# Altium schematic symbol library relay.SCHLIB: 425 symbols (part 1 of 3) (continued)
## AQZ*
designator K?, comment Power PhotoMOS Relay NAiS   Source: http://www.panasonic-electric-works.com/catalogues/downloads/photomos/ds_x615_en_aqz10_20.pdf
MPN: AQZ102; MPN: AQZ104; MPN: AQZ105; MPN: AQZ107; MPN: AQZ202; MPN: AQZ204; MPN: AQZ205; MPN: AQZ207; MF: AROMAT/ MATSUSHITA; OC_FARNELL: 1448345; OC_NEWARK: 52F5584; OC_FARNELL: unknown; OC_NEWARK: 13P1217; OC_NEWARK: 13P1218; OC_NEWARK: 50B844; OC_FARNELL: 1175735; OC_NEWARK: 13P1220; OC_NEWARK: 13P1222; OC_FARNELL: 1175736; OC_NEWARK: 13P1223; OC_FARNELL: 1129299; OC_NEWARK: 64K3058
footprint AQZ-SIL04
pins: 1 K, 2 A, 3 DS1, 4 DS2

## AQZ*404-PS
designator K?, comment Power PhotoMOS Relay NAiS   Source: http://www.panasonic-electric-works.com/catalogues/downloads/photomos/ds_x615_en_aqz10_20.pdf
MPN: AQZ404; OC_FARNELL: 1101853; OC_NEWARK: 13P1226
footprint AQZ404-PS
pins: 1 K, 2 A, 5 DS1, 6 DS2

## ATP1211S*
designator K?, comment Phototriac Coupler with Zero-Cross NAiS   Source: http://www.mew-europe.com/.. en_ds_61690_0000.pdf
OC_FARNELL: unknown; OC_NEWARK: unknown
footprint SOP04
pins: 1 A, 2 K, 3 DS2, 4 DS1

## ATP2121S*
designator K?, comment Phototriac Coupler none Zero-Cross NAiS   Source: http://www.mew-europe.com/.. en_ds_61690_0000.pdf
OC_FARNELL: unknown; OC_NEWARK: unknown
footprint SOP04
pins: 1 A, 2 K, 3 DS2, 4 DS1

## AZ8-FORM-A
designator K?, comment MINIATURE PC BOARD RELAY Form A   Source: www.azettler.com .. AZ8-1ch-12DSE.PDF
OC_FARNELL: unknown; OC_NEWARK: unknown
footprint AZ8
part A pins: 2 1, 5 2
part B pins: 1 P, 3 S

## AZ8-FORM-C
designator K?, comment MINIATURE PC BOARD RELAY Form C   Source: www.azettler.com .. AZ8-1ch-12DSE.PDF
OC_FARNELL: unknown; OC_NEWARK: unknown
footprint AZ8
part A pins: 2 1, 5 2
part B pins: 1 P, 3 S, 4 O

## BT-*-S
designator K?, comment KLEIN RELAIS WASCHDICHT 2 Wechsler   Distriibutor: Conrad Electronic, Bestell Nr.: 505226-13 - 24V 505226-13 - 5V 505170-13 - 12V 505170-13 - 48V Bestar Electric Ltd.Source: http://www2.produktinfo.conrad.com/datenblaetter/500000-524999/505226-da-01-en-Kleinrelais_waschdicht_24V.pdf
OC_FARNELL: unknown; OC_NEWARK: unknown
footprint BT-XX-S
part A pins: 1, 16 2
part B pins: 4 P, 6 O, 8 S
part C pins: 9 S, 11 O, 13 P

## CB1*
designator K?, comment HIGH POWER AUTOMOTIVE RELAY Form C NAiS   Source: http://www.mew-europe.com/..  en_ds_61202_0000.pdf
MPN: CB1-P-12V; MPN: CB1-P-24V; MPN: CB1F-P-12V; MPN: CB1F-P-24V; MF: AROMAT/ MATSUSHITA; OC_FARNELL: unknown; OC_NEWARK: 52F9201; OC_FARNELL: 4168987; OC_NEWARK: 07C0827; OC_FARNELL: 1414069; OC_NEWARK: 50F4024; OC_FARNELL: 1423191; OC_NEWARK: 94B6706
footprint CB1
part A pins: 85 2, 86 1
part B pins: 30 P, 87 S, 87A O

## CB1*V
designator K?, comment HIGH POWER AUTOMOTIVE RELAY Form A with Diode NAiS   Source: http://www.mew-europe.com/..  en_ds_61202_0000.pdf
MPN: CB1-D-P-12V; MPN: CB1-D-P-24V; MPN: CB1A-D-P-12V; MF: AROMAT/ MATSUSHITA; OC_FARNELL: unknown; OC_NEWARK: 10C5390; OC_NEWARK: 10C5392; OC_NEWARK: 13P2827; OC_NEWARK: unknown
footprint CB1
part A pins: 85 -, 86 +
part B pins: 30 P, 87 S

## CB*
designator K?, comment HIGH POWER AUTOMOTIVE RELAY Form A NAiS   Source: http://www.mew-europe.com/..  en_ds_61202_0000.pdf
MPN: CB1A-P-12V; MPN: CB1A-P-24V; MPN: CB1A-T-P-12V; MF: AROMAT/ MATSUSHITA; OC_FARNELL: 1270582; OC_NEWARK: 50B849; OC_FARNELL: unknown; OC_NEWARK: 13P2833; OC_NEWARK: 26H6273; OC_NEWARK: unknown
footprint CB1
part A pins: 85 2, 86 1
part B pins: 30 P, 87 S

## CF2*
designator K?, comment NEW DUAL POWER AUTOMOTIVE RELAY NAiS   Source: http://www.mew-europe.com/..  en_ds_61203_0000.pdf
OC_FARNELL: unknown; OC_NEWARK: unknown
footprint CF
part A pins: 1, 1A 2
part B pins: 2 1, 2A 2
part C pins: C1 COM1, C2 COM2, NC, NO

## CM1*
designator K?, comment AUTOMOTIVE MICRO-ISO RELAY NAiS   en_ds_61204_0000.pdf
MPN: CM1-P-12V; MPN: CM1F-P-12V; MF: AROMAT/ MATSUSHITA; OC_FARNELL: unknown; OC_NEWARK: 50B850; OC_NEWARK: unknown; OC_NEWARK: 10C5503
footprint CM
part A pins: 85 1, 86 2
part B pins: 30 P, 87 S, 87A O

## CM1A*
designator K?, comment AUTOMOTIVE MICRO-ISO RELAY NAiS   en_ds_61204_0000.pdf
MPN: CM1A-P-12V; MPN: CM1AF-P-12V; MF: AROMAT/ MATSUSHITA; OC_FARNELL: unknown; OC_NEWARK: 10C5491; OC_NEWARK: unknown; OC_NEWARK: 10C5497
footprint CM
part A pins: 85 1, 86 2
part B pins: 30 P, 87 S

## CP1?-*
designator K?, comment ULTRA-MINIATURE LOW PROFILE AUTOMOTIVE RELAY NAiS   Source: http://www.mew-europe.com/.. en_ds_61207_0000.pdf
MPN: CP1-12V; MF: AROMAT/ MATSUSHITA; OC_FARNELL: unknown; OC_NEWARK: 10C5508
footprint CP1
part A pins: 1, 2
part B pins: C P, NC O, NO S

## CP1?-*SA
designator K?, comment ULTRA-MINIATURE LOW PROFILE AUTOMOTIVE RELAY NAiS   Source: http://www.mew-europe.com/.. en_ds_61207_0000.pdf
MPN: CP1SA-12V-X; OC_FARNELL: unknown; OC_NEWARK: 96K2384
footprint CP1SA
part A pins: 1, 2
part B pins: C P, NC O, NO S

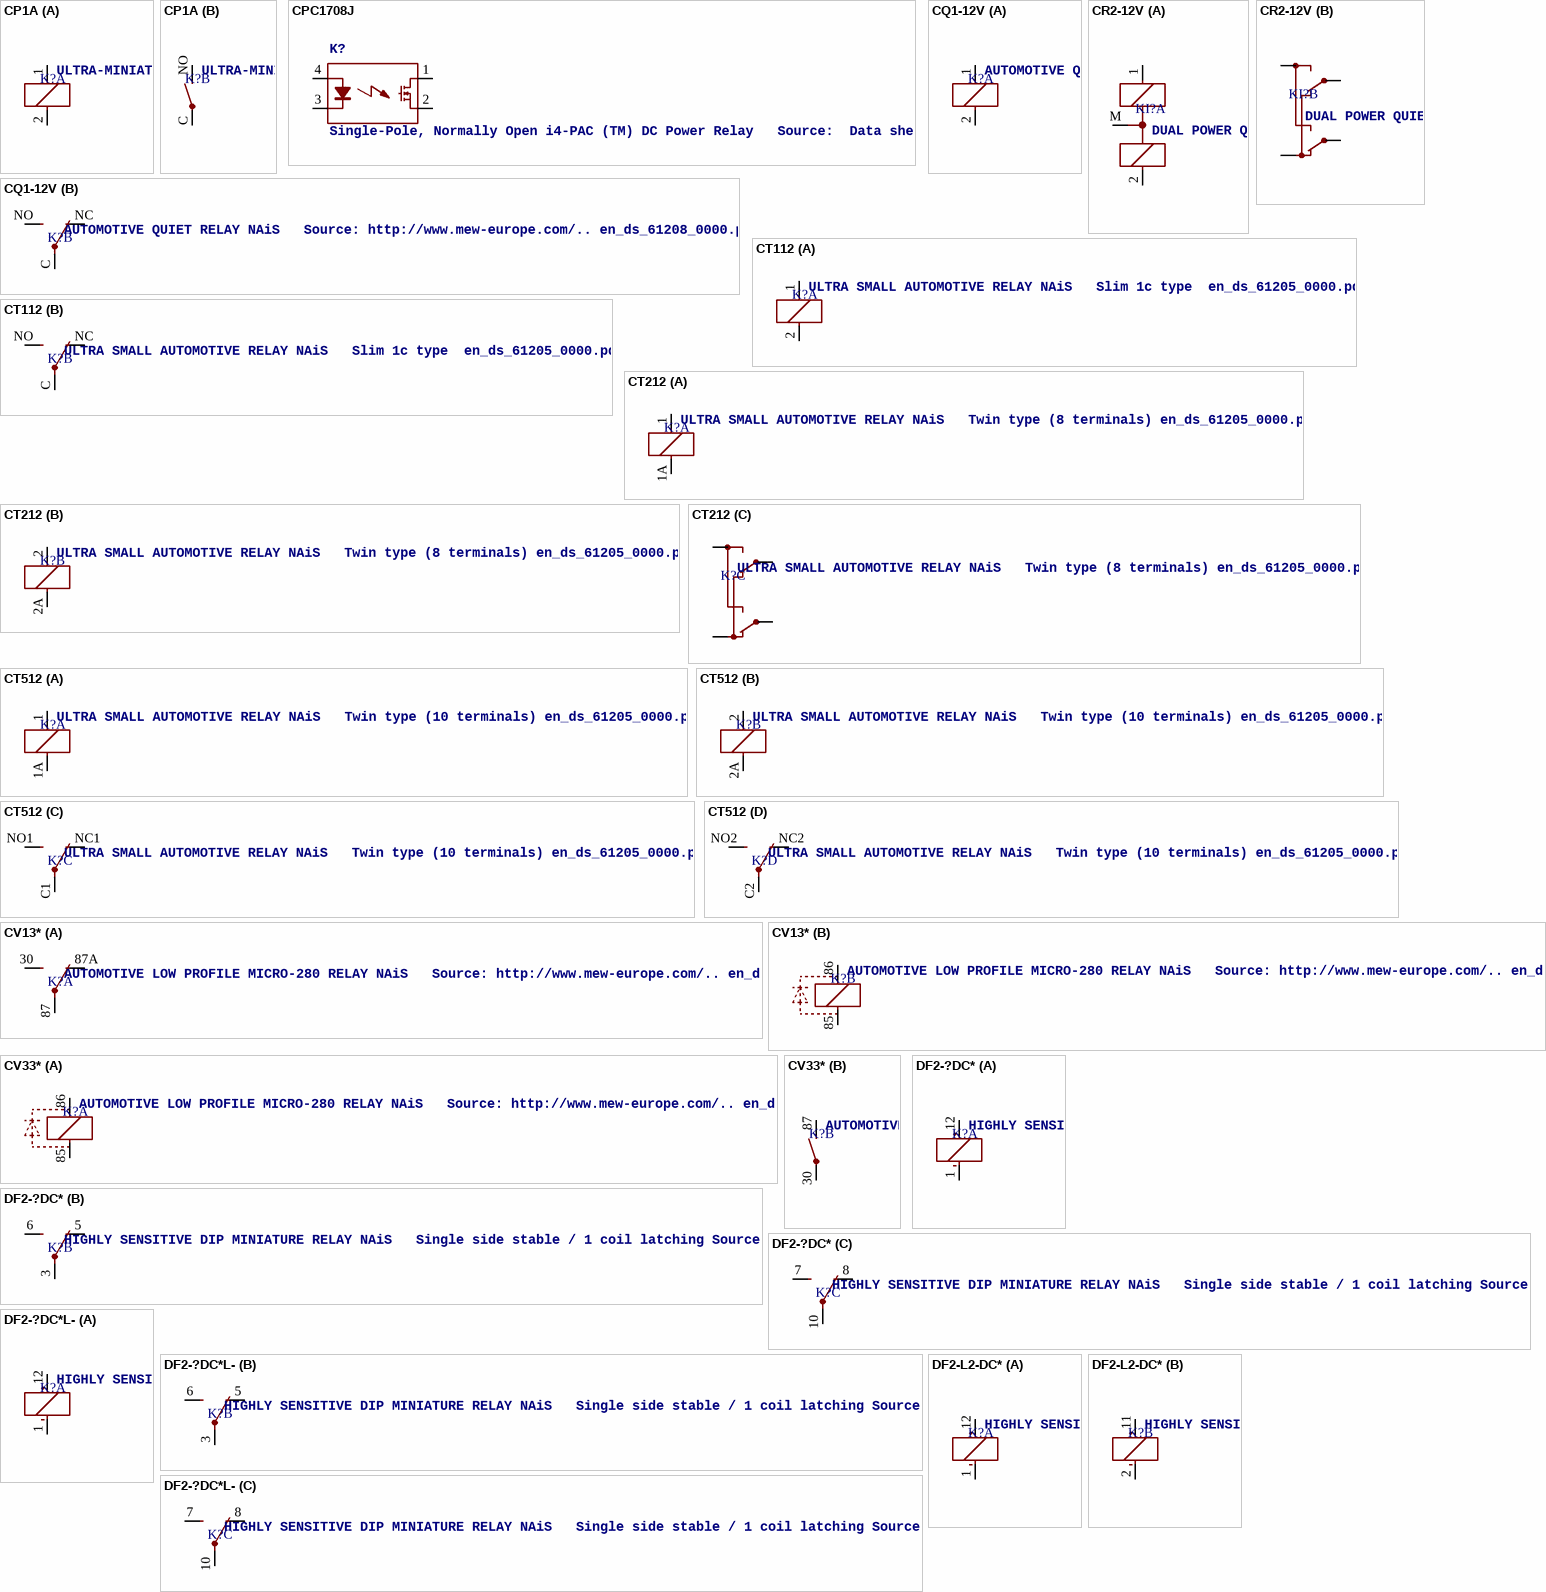
[diagram p5: symbols CP1A to DF2-L2-DC*]

## CP1A
designator K?, comment ULTRA-MINIATURE LOW PROFILE AUTOMOTIVE RELAY NAiS   Source: http://www.mew-europe.com/.. en_ds_61207_0000.pdf
MPN: CP1A-12V; MF: AROMAT/ MATSUSHITA; OC_FARNELL: 1629083; OC_NEWARK: 10C5509
footprint CP1A
part A pins: 1, 2
part B pins: C P, NO S

## CPC1708J
designator K?, comment Single-Pole, Normally Open i4-PAC (TM) DC Power Relay   Source:  Data sheet
footprint I4-PAC
pins: 1 DS1, 2 DS2, 3 K, 4 A

## CQ1-12V
designator K?, comment AUTOMOTIVE QUIET RELAY NAiS   Source: http://www.mew-europe.com/.. en_ds_61208_0000.pdf
OC_FARNELL: unknown; OC_NEWARK: unknown
footprint CQ1
part A pins: 1, 2
part B pins: C P, NC O, NO S

## CR2-12V
designator KI?, comment DUAL POWER QUIET AUTOMOTIVE RELAY NAiS   Source: http://www.mew-europe.com/.. en_ds_61209_0000.pdf
MPN: CR2-12V; MF: AROMAT/ MATSUSHITA; OC_FARNELL: unknown; OC_NEWARK: 10C5511
footprint CR2
part A pins: 1, 2, M
part B pins: C1 COM1, C2 COM2, NC, NO

## CT112
designator K?, comment ULTRA SMALL AUTOMOTIVE RELAY NAiS   Slim 1c type  en_ds_61205_0000.pdf
OC_FARNELL: unknown; OC_NEWARK: unknown
footprint CT-SLIM
part A pins: 1, 2
part B pins: C P, NC O, NO S

## CT212
designator K?, comment ULTRA SMALL AUTOMOTIVE RELAY NAiS   Twin type (8 terminals) en_ds_61205_0000.pdf
OC_FARNELL: unknown; OC_NEWARK: unknown
footprint CT-TWIN
part A pins: 1, 1A 2
part B pins: 2 1, 2A 2
part C pins: C1 COM1, C2 COM2, NC, NO

## CT512
designator K?, comment ULTRA SMALL AUTOMOTIVE RELAY NAiS   Twin type (10 terminals) en_ds_61205_0000.pdf
OC_FARNELL: unknown; OC_NEWARK: unknown
footprint CT2-TWIN
part A pins: 1, 1A 2
part B pins: 2 1, 2A 2
part C pins: C1 P, NC1 O, NO1 S
part D pins: C2 P, NC2 O, NO2 S

## CV13*
designator K?, comment AUTOMOTIVE LOW PROFILE MICRO-280 RELAY NAiS   Source: http://www.mew-europe.com/.. en_ds_61214_0000.pdf
MPN: ACV13012; OC_FARNELL: unknown; OC_NEWARK: 39M3504; OC_NEWARK: unknown
footprint CV-MIRO-280
part A pins: 30 S, 87 P, 87A O
part B pins: 85 -, 86 +

## CV33*
designator K?, comment AUTOMOTIVE LOW PROFILE MICRO-280 RELAY NAiS   Source: http://www.mew-europe.com/.. en_ds_61214_0000.pdf
MPN: ACV33012; OC_FARNELL: unknown; OC_NEWARK: 39M3505; OC_NEWARK: unknown
footprint CV1A-MICRO-280
part A pins: 85 -, 86 +
part B pins: 30 P, 87 S

## DF2-?DC*
designator K?, comment HIGHLY SENSITIVE DIP MINIATURE RELAY NAiS   Single side stable / 1 coil latching Source: http://www.mew-europe.com/..  en_ds_61002_0000.pdf
OC_FARNELL: unknown; OC_NEWARK: unknown
footprint DF2
part A pins: 1 -, 12 +
part B pins: 3 P, 5 O, 6 S
part C pins: 7 S, 8 O, 10 P

## DF2-?DC*L-
designator K?, comment HIGHLY SENSITIVE DIP MINIATURE RELAY NAiS   Single side stable / 1 coil latching Source: http://www.mew-europe.com/..  en_ds_61002_0000.pdf
OC_FARNELL: unknown; OC_NEWARK: unknown
footprint DF2
part A pins: 1 -, 12 +
part B pins: 3 P, 5 O, 6 S
part C pins: 7 S, 8 O, 10 P

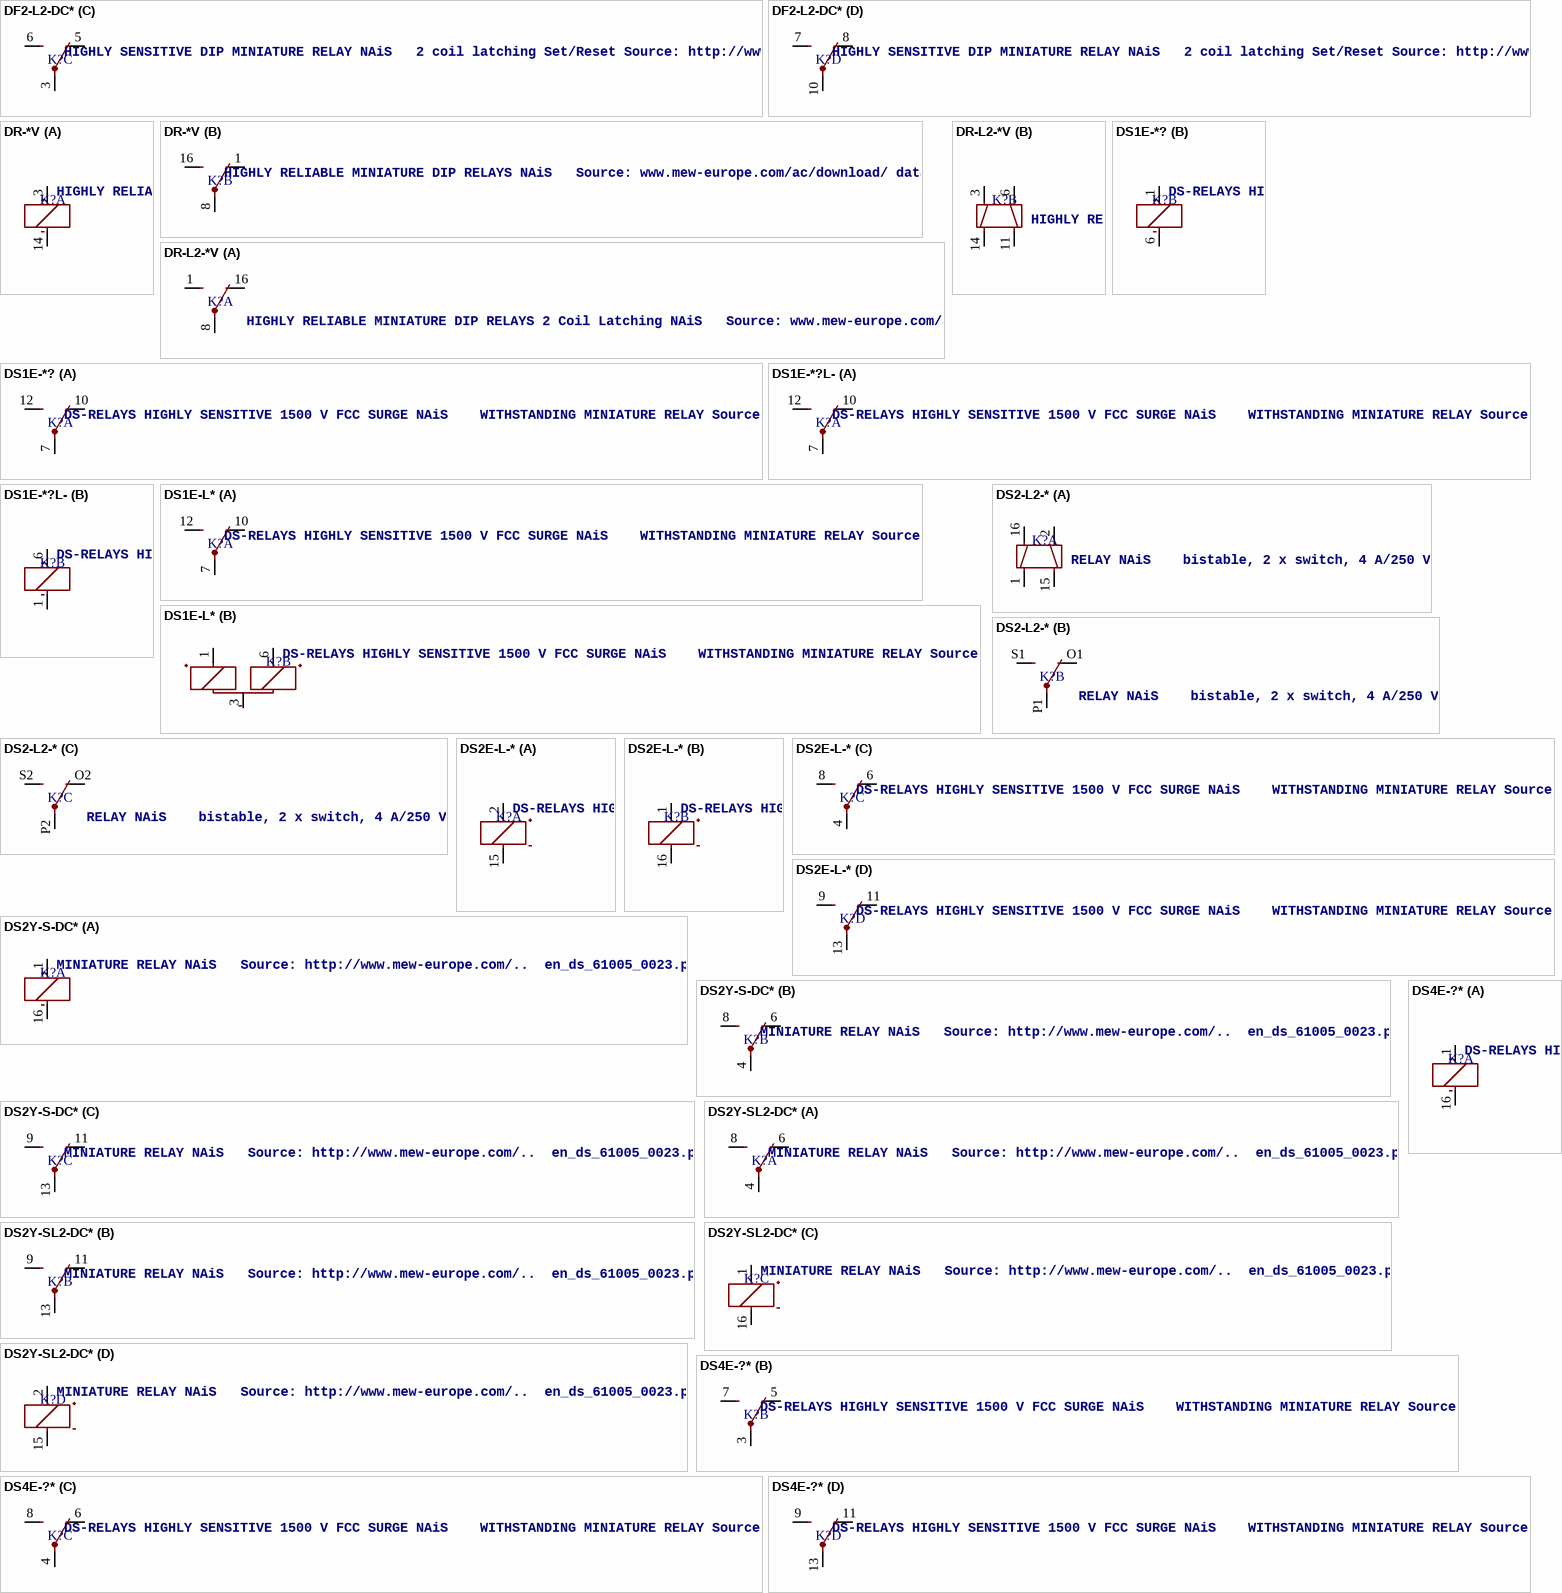
[diagram p6: symbols DF2-L2-DC* to DS4E-?*]

## DF2-L2-DC*
designator K?, comment HIGHLY SENSITIVE DIP MINIATURE RELAY NAiS   2 coil latching Set/Reset Source: http://www.mew-europe.com/..  en_ds_61002_0000.pdf
OC_FARNELL: unknown; OC_NEWARK: unknown
footprint DF2-L2
part A pins: 1 -, 12 +
part B pins: 2 -, 11 +
part C pins: 3 P, 5 O, 6 S
part D pins: 7 S, 8 O, 10 P

## DR-*V
designator K?, comment HIGHLY RELIABLE MINIATURE DIP RELAYS NAiS   Source: www.mew-europe.com/ac/download/ datasheet/relay/dr_en.pdf
MPN: DR-12V; MPN: DR-24V; MPN: DR-5V; OC_FARNELL: 1124066; OC_NEWARK: 91K6794; OC_FARNELL: unknown; OC_NEWARK: unknown; OC_FARNELL: 1124068; OC_NEWARK: 21M8932; OC_FARNELL: 1124065; OC_NEWARK: 24M1478
footprint DR-1
part A pins: 3 +, 14 -
part B pins: 1 O, 8 P, 16 S

## DR-L2-*V
designator K?, comment HIGHLY RELIABLE MINIATURE DIP RELAYS 2 Coil Latching NAiS   Source: www.mew-europe.com/ac/download/datasheet/relay/dr_en.pdf
OC_FARNELL: unknown; OC_NEWARK: unknown
footprint DR-2
part A pins: 1 S, 8 P, 16 O
part B pins: 3 1, 6 3, 11 4, 14 2

## DS1E-*?
designator K?, comment DS-RELAYS HIGHLY SENSITIVE 1500 V FCC SURGE NAiS    WITHSTANDING MINIATURE RELAY Source: http://www.mew-europe.com/..  en_ds_61005_0001.pdf
OC_FARNELL: unknown; OC_NEWARK: unknown
footprint DS1E
part A pins: 7 P, 10 O, 12 S
part B pins: 1 +, 6 -

## DS1E-*?L-
designator K?, comment DS-RELAYS HIGHLY SENSITIVE 1500 V FCC SURGE NAiS    WITHSTANDING MINIATURE RELAY Source: http://www.mew-europe.com/..  en_ds_61005_0001.pdf
MPN: DS1E-S-DC12V; MPN: DS1E-S-DC24V; MPN: DS1E-S-DC48V; MPN: DS1E-S-DC9V; OC_FARNELL: unknown; OC_NEWARK: unknown; OC_FARNELL: 1652598; OC_NEWARK: 13P3215; OC_FARNELL: 1372701; OC_NEWARK: 13P3216; OC_NEWARK: 13P3218; OC_FARNELL: 1608323; OC_FARNELL: 1372683; OC_NEWARK: 13P3221
footprint DS1E
part A pins: 7 P, 10 O, 12 S
part B pins: 1 -, 6 +

## DS1E-L*
designator K?, comment DS-RELAYS HIGHLY SENSITIVE 1500 V FCC SURGE NAiS    WITHSTANDING MINIATURE RELAY Source: http://www.mew-europe.com/..  en_ds_61005_0001.pdf
MPN: DS1E-SL-DC12V; MPN: DS1E-SL-DC48V; MPN: DS1E-SL-DC5V; MF: AROMAT/ MATSUSHITA; OC_FARNELL: unknown; OC_NEWARK: unknown; OC_NEWARK: 13P3222; OC_NEWARK: 10C5700; OC_NEWARK: 10C5701
footprint DS1E-L
part A pins: 7 P, 10 O, 12 S
part B pins: 1 S+, 3 -, 6 R+

## DS2-L2-*
designator K?, comment RELAY NAiS    bistable, 2 x switch, 4 A/250 V
OC_FARNELL: unknown; OC_NEWARK: unknown
footprint DS2E-L2
part A pins: 1 2, 2 3, 15 4, 16 1
part B pins: O1 O, P1 P, S1 S
part C pins: O2 O, P2 P, S2 S

## DS2E-L-*
designator K?, comment DS-RELAYS HIGHLY SENSITIVE 1500 V FCC SURGE NAiS    WITHSTANDING MINIATURE RELAY Source:  Panasonic data sheet
MPN: DS2E-SL-DC24V; MPN: DS2E-SL-DC5V; MF: AROMAT/ MATSUSHITA; OC_FARNELL: unknown; OC_NEWARK: unknown; OC_NEWARK: 10C5812; OC_NEWARK: 10C5815
footprint DS2E-L
part A pins: 2 +, 15 -
part B pins: 1 +, 16 -
part C pins: 4 P, 6 O, 8 S
part D pins: 9 S, 11 O, 13 P

## DS2Y-S-DC*
designator K?, comment MINIATURE RELAY NAiS   Source: http://www.mew-europe.com/..  en_ds_61005_0023.pdf
MPN: DS2Y-S-DC1.5V; MPN: DS2Y-S-DC12V; MPN: DS2Y-S-DC24V; MPN: DS2Y-S-DC3V; MPN: DS2Y-S-DC48V; MPN: DS2Y-S-DC5V; MPN: DS2Y-S-DC6V; MPN: DS2Y-S-DC9V; OC_FARNELL: unknown; OC_NEWARK: 10C5827; OC_NEWARK: 13P3261; OC_NEWARK: 13P3264; OC_NEWARK: 10C5832; OC_NEWARK: 13P3267; OC_NEWARK: 13P3268; OC_NEWARK: 13P3271; OC_NEWARK: 13P3272
footprint DS2Y
part A pins: 1 +, 16 -
part B pins: 4 P, 6 O, 8 S
part C pins: 9 S, 11 O, 13 P

## DS2Y-SL2-DC*
designator K?, comment MINIATURE RELAY NAiS   Source: http://www.mew-europe.com/..  en_ds_61005_0023.pdf
MPN: DS2Y-SL2-DC1.5V; MPN: DS2Y-SL2-DC12V; MPN: DS2Y-SL2-DC24V; MPN: DS2Y-SL2-DC3V; MPN: DS2Y-SL2-DC48V; MPN: DS2Y-SL2-DC5V; MPN: DS2Y-SL2-DC6V; MPN: DS2Y-SL2-DC9V; MF: AROMAT/ MATSUSHITA; OC_FARNELL: unknown; OC_NEWARK: 10C5841; OC_NEWARK: 52F9208; OC_FARNELL: 1372981; OC_NEWARK: 64K3125; OC_NEWARK: 91B6712; OC_NEWARK: 10C5844; OC_NEWARK: 93F4484; OC_NEWARK: 99F8886; OC_NEWARK: 10C5848
footprint DS2Y-2
part A pins: 4 P, 6 O, 8 S
part B pins: 9 S, 11 O, 13 P
part C pins: 1 +, 16 -
part D pins: 2 +, 15 -

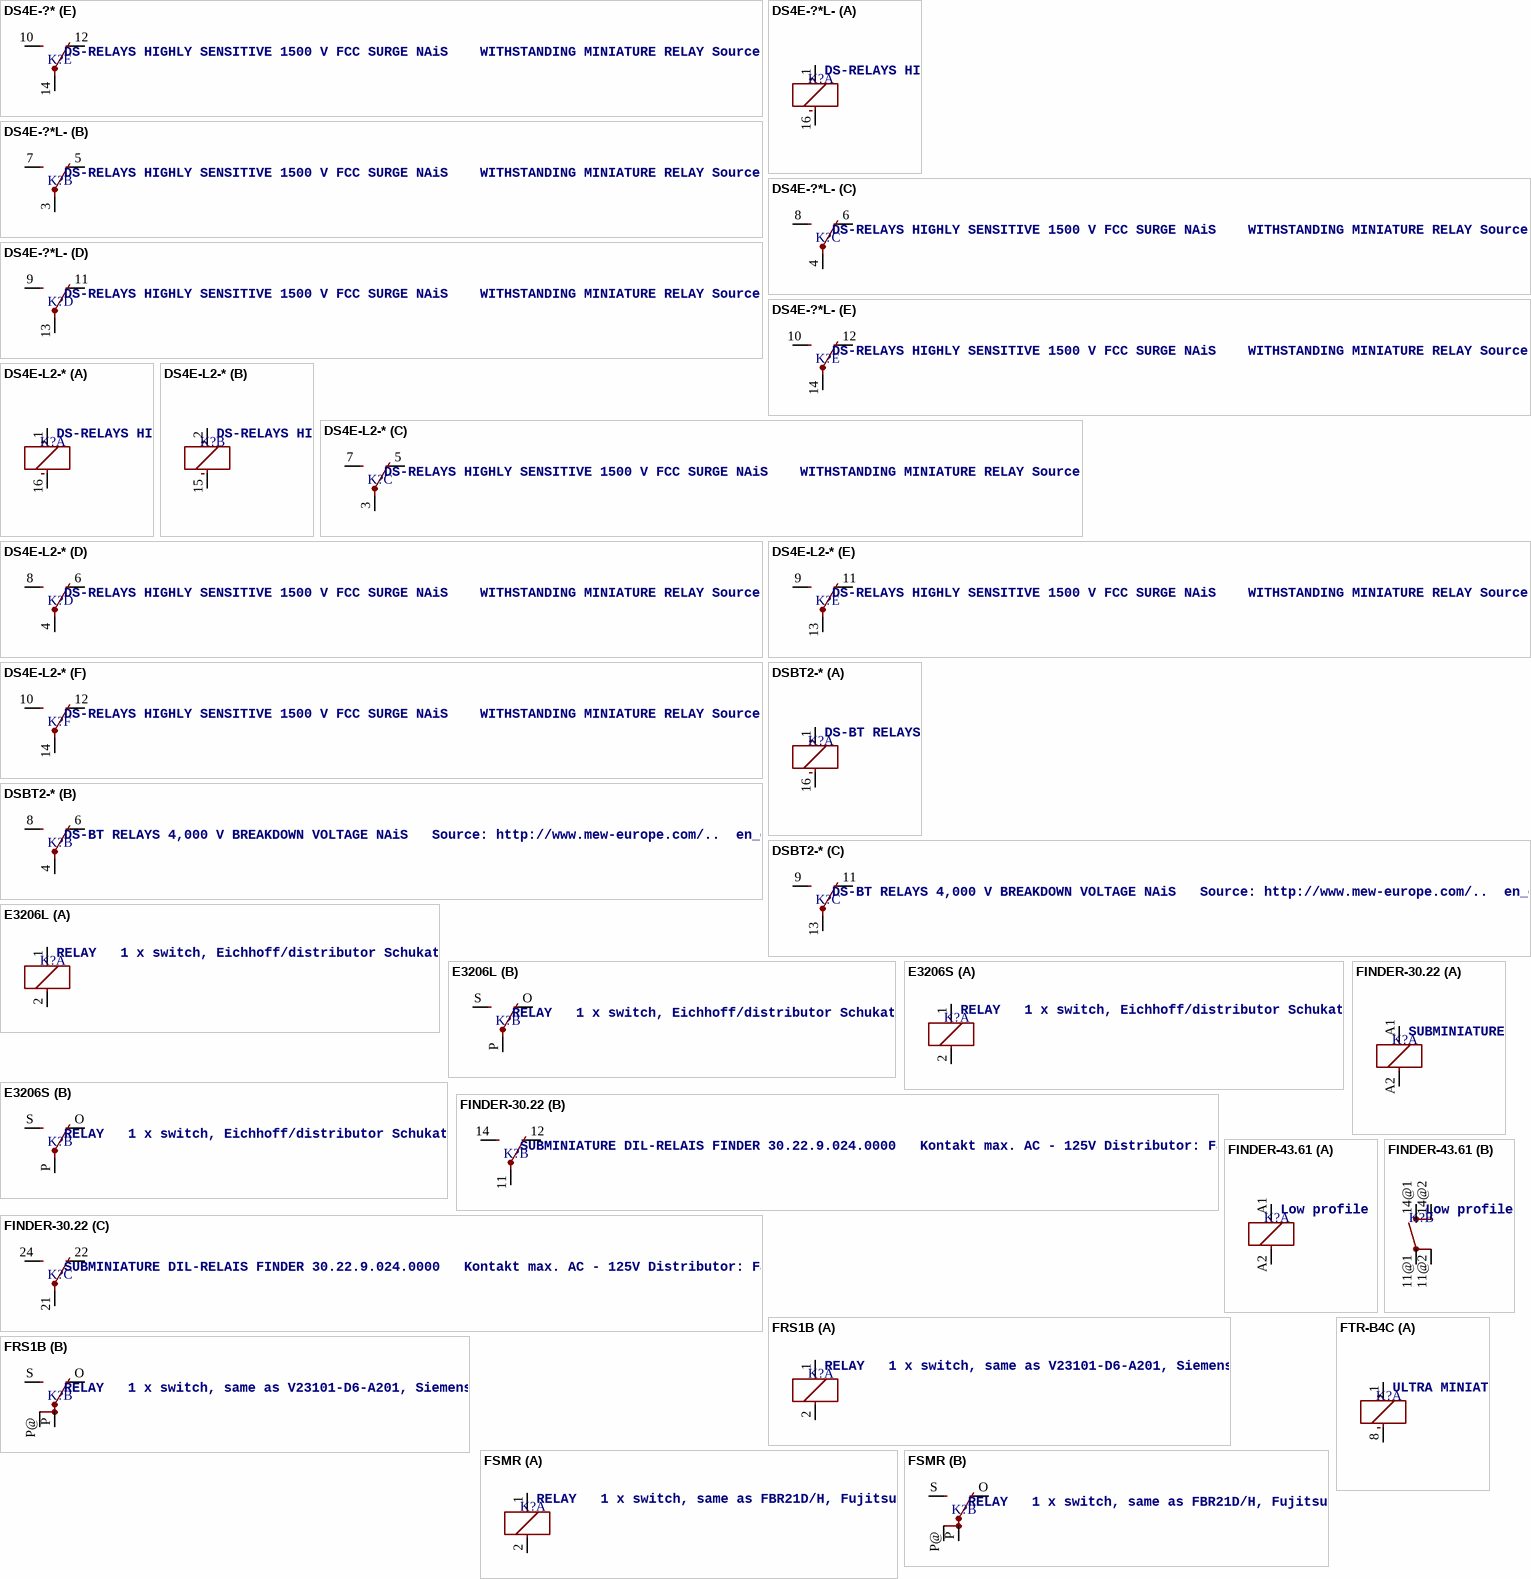
[diagram p7: symbols DS4E-?* to FTR-B4C]

## DS4E-?*
designator K?, comment DS-RELAYS HIGHLY SENSITIVE 1500 V FCC SURGE NAiS    WITHSTANDING MINIATURE RELAY Source: http://www.mew-europe.com/..  en_ds_61005_0001.pdf
OC_FARNELL: unknown; OC_NEWARK: unknown
footprint DS4E
part A pins: 1 +, 16 -
part B pins: 3 P, 5 O, 7 S
part C pins: 4 P, 6 O, 8 S
part D pins: 9 S, 11 O, 13 P
part E pins: 10 S, 12 O, 14 P

## DS4E-?*L-
designator K?, comment DS-RELAYS HIGHLY SENSITIVE 1500 V FCC SURGE NAiS    WITHSTANDING MINIATURE RELAY Source: http://www.mew-europe.com/..  en_ds_61005_0001.pdf
OC_FARNELL: unknown; OC_NEWARK: unknown
footprint DS4E
part A pins: 1 +, 16 -
part B pins: 3 P, 5 O, 7 S
part C pins: 4 P, 6 O, 8 S
part D pins: 9 S, 11 O, 13 P
part E pins: 10 S, 12 O, 14 P

## DS4E-L2-*
designator K?, comment DS-RELAYS HIGHLY SENSITIVE 1500 V FCC SURGE NAiS    WITHSTANDING MINIATURE RELAY Source: http://www.mew-europe.com/..  en_ds_61005_0001.pdf
OC_FARNELL: unknown; OC_NEWARK: unknown
footprint DS4E-L
part A pins: 1 +, 16 -
part B pins: 2 +, 15 -
part C pins: 3 P, 5 O, 7 S
part D pins: 4 P, 6 O, 8 S
part E pins: 9 S, 11 O, 13 P
part F pins: 10 S, 12 O, 14 P

## DSBT2-*
designator K?, comment DS-BT RELAYS 4,000 V BREAKDOWN VOLTAGE NAiS   Source: http://www.mew-europe.com/..  en_ds_61005_0010.pdf
MPN: DSBT2-S-DC3V; OC_FARNELL: unknown; OC_NEWARK: unknown; OC_NEWARK: 11N4489
footprint DS-BT
part A pins: 1 +, 16 -
part B pins: 4 P, 6 O, 8 S
part C pins: 9 S, 11 O, 13 P

## E3206L
designator K?, comment RELAY   1 x switch, Eichhoff/distributor Schukat
OC_FARNELL: unknown; OC_NEWARK: unknown
footprint E3206L
part A pins: 1, 2
part B pins: O, P, S

## E3206S
designator K?, comment RELAY   1 x switch, Eichhoff/distributor Schukat
OC_FARNELL: unknown; OC_NEWARK: unknown
footprint E3206S
part A pins: 1, 2
part B pins: O, P, S

## FINDER-30.22
designator K?, comment SUBMINIATURE DIL-RELAIS FINDER 30.22.9.024.0000   Kontakt max. AC - 125V Distributor: Farnell Bestell Nr.: 1217371 Source: http://www.farnell.com/datasheets/87634.pdf
OC_FARNELL: unknown; OC_NEWARK: unknown
footprint FINDER-30.22
part A pins: A1 1, A2 2
part B pins: 11 P, 12 O, 14 S
part C pins: 21 P, 22 O, 24 S

## FINDER-43.61
designator K?, comment Low profile PCB relays 10 - 16 A FINDER 43 Series   Kontakt max. AC- 250V,  Strom - Kontakt  AC- max. 10A 5 mm contact pin pitch,  1 Pole NO, 16 A, PCB mount Distributor: FARNELL Source: http://www.farnell.com/datasheets/87682.pdf
OC_FARNELL: unknown; OC_NEWARK: unknown
footprint FINDER-43.61
part A pins: A1 1, A2 2
part B pins: 11@1 PA, 11@2 PB, 14@1 SA, 14@2 SB

## FRS1B
designator K?, comment RELAY   1 x switch, same as V23101-D6-A201, Siemens
OC_FARNELL: unknown; OC_NEWARK: unknown
footprint FRS1B
part A pins: 1, 2
part B pins: O, P, P@ P@1, S

## FSMR
designator K?, comment RELAY   1 x switch, same as FBR21D/H, Fujitsu
OC_FARNELL: unknown; OC_NEWARK: unknown
footprint FSMR
part A pins: 1, 2
part B pins: O, P, P@ P@1, S

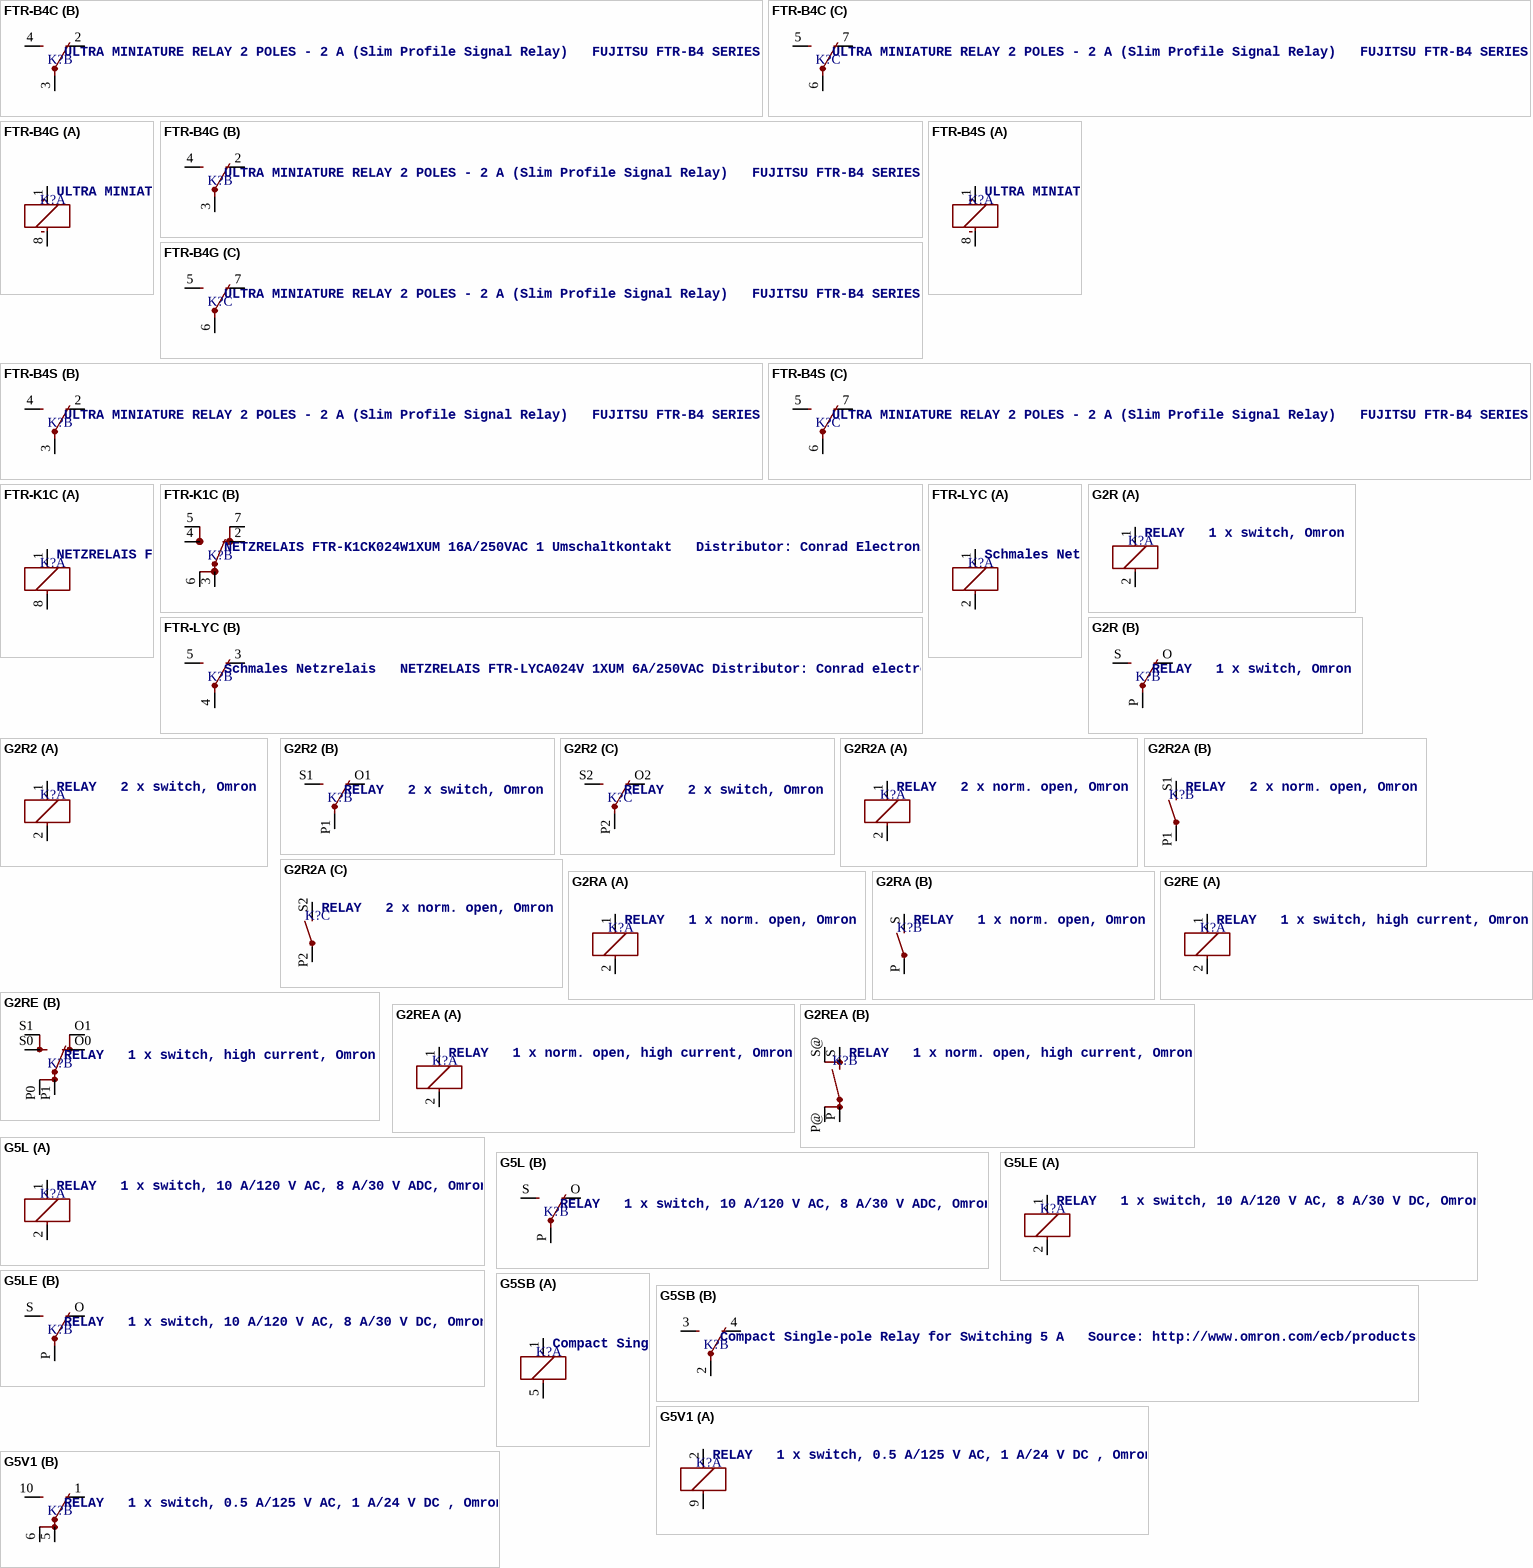
[diagram p8: symbols FTR-B4C to G5V1]

## FTR-B4C
designator K?, comment ULTRA MINIATURE RELAY 2 POLES - 2 A (Slim Profile Signal Relay)   FUJITSU FTR-B4 SERIES Source: FTR-B4.pdf
footprint FTR-B4C
part A pins: 1 +, 8 -
part B pins: 2 O, 3 P, 4 S
part C pins: 5 S, 6 P, 7 O

## FTR-B4G
designator K?, comment ULTRA MINIATURE RELAY 2 POLES - 2 A (Slim Profile Signal Relay)   FUJITSU FTR-B4 SERIES Source: FTR-B4.pdf
footprint FTR-B4G
part A pins: 1 +, 8 -
part B pins: 2 O, 3 P, 4 S
part C pins: 5 S, 6 P, 7 O

## FTR-B4S
designator K?, comment ULTRA MINIATURE RELAY 2 POLES - 2 A (Slim Profile Signal Relay)   FUJITSU FTR-B4 SERIES Source: FTR-B4.pdf
footprint FTR-B4S
part A pins: 1 +, 8 -
part B pins: 2 O, 3 P, 4 S
part C pins: 5 S, 6 P, 7 O

## FTR-K1C
designator K?, comment NETZRELAIS FTR-K1CK024W1XUM 16A/250VAC 1 Umschaltkontakt   Distributor: Conrad Electronic Bestell Nr.: 504389-13 - 24V Source: http://www.produktinfo.conrad.com/datenblaetter/500000-524999/504384-da-01-de-NETZRELAIS_FTR_K1CK012W1XUM_16A_250VAC.pdf
OC_FARNELL: unknown; OC_NEWARK: unknown
footprint FTR-K1C
part A pins: 1, 8 2
part B pins: 2 OA, 3 PA, 4 SA, 5 SB, 6 PB, 7 OB

## FTR-LYC
designator K?, comment Schmales Netzrelais   NETZRELAIS FTR-LYCA024V 1XUM 6A/250VAC Distributor: Conrad electronic Bestell Nr.: 504382 - 62  Source: http://www2.produktinfo.conrad.com/datenblaetter/500000-524999/504382-da-01-de-NETZRELAIS_FTR-LYCA024V_1XUM_6A_250VAC.pdf
OC_FARNELL: unknown; OC_NEWARK: unknown
footprint FTR-LYC
part A pins: 1, 2
part B pins: 3 O, 4 P, 5 S

## G2R
designator K?, comment RELAY   1 x switch, Omron
OC_FARNELL: 1569185; OC_NEWARK: unknown
footprint G2R
part A pins: 1, 2
part B pins: O, P, S

## G2R2
designator K?, comment RELAY   2 x switch, Omron
MPN: G2R-2-DC6; MF: OMRON COMPONENTS USA; OC_FARNELL: unknown; OC_NEWARK: 89C5317
footprint G2R2
part A pins: 1, 2
part B pins: O1 O, P1 P, S1 S
part C pins: O2 O, P2 P, S2 S

## G2R2A
designator K?, comment RELAY   2 x norm. open, Omron
MPN: G2R-2A-DC24; OC_FARNELL: 6985269; OC_NEWARK: 36M5257
footprint G2R2A
part A pins: 1, 2
part B pins: P1 P, S1 S
part C pins: P2 P, S2 S

## G2RA
designator K?, comment RELAY   1 x norm. open, Omron
OC_FARNELL: unknown; OC_NEWARK: unknown
footprint G2RA
part A pins: 1, 2
part B pins: P, S

## G2RE
designator K?, comment RELAY   1 x switch, high current, Omron
OC_FARNELL: unknown; OC_NEWARK: unknown
footprint G2RE
part A pins: 1, 2
part B pins: O0 O, O1 O@1, P0 P@1, P1 P, S0 S, S1 S@1

## G2REA
designator K?, comment RELAY   1 x norm. open, high current, Omron
OC_FARNELL: unknown; OC_NEWARK: unknown
footprint G2REA
part A pins: 1, 2
part B pins: P, P@ P@1, S, S@ S@1

## G5L
designator K?, comment RELAY   1 x switch, 10 A/120 V AC, 8 A/30 V ADC, Omron
OC_FARNELL: unknown; OC_NEWARK: unknown
footprint G5LE
part A pins: 1, 2
part B pins: O, P, S

## G5LE
designator K?, comment RELAY   1 x switch, 10 A/120 V AC, 8 A/30 V DC, Omron
OC_FARNELL: unknown; OC_NEWARK: unknown
footprint G5LE
part A pins: 1, 2
part B pins: O, P, S

## G5SB
designator K?, comment Compact Single-pole Relay for Switching 5 A   Source: http://www.omron.com/ecb/products/pry/121/g5sb.html
OC_FARNELL: unknown; OC_NEWARK: unknown
footprint G5SB
part A pins: 1, 5 2
part B pins: 2 P, 3 S, 4 O

## G5V1
designator K?, comment RELAY   1 x switch, 0.5 A/125 V AC, 1 A/24 V DC , Omron
MPN: G5V-1-DC24; OC_FARNELL: 9949593; OC_NEWARK: 36M6377
footprint G5V1
part A pins: 2 1, 9 2
part B pins: 1 O, 5 P, 6 P@1, 10 S
